# Altium footprint library mw.PcbLib: 113 footprints (part 4 of 8)
Each footprint in its own frame and in the unit in brackets; x right, y up, seen from the top. Pads: shape width x height; smd on the part's side, far side on the other; paste and mask are expansions set on the pad; w line width, h text height; cw(c..) or ccw(c..) is an arc to the next point about the centre after c.
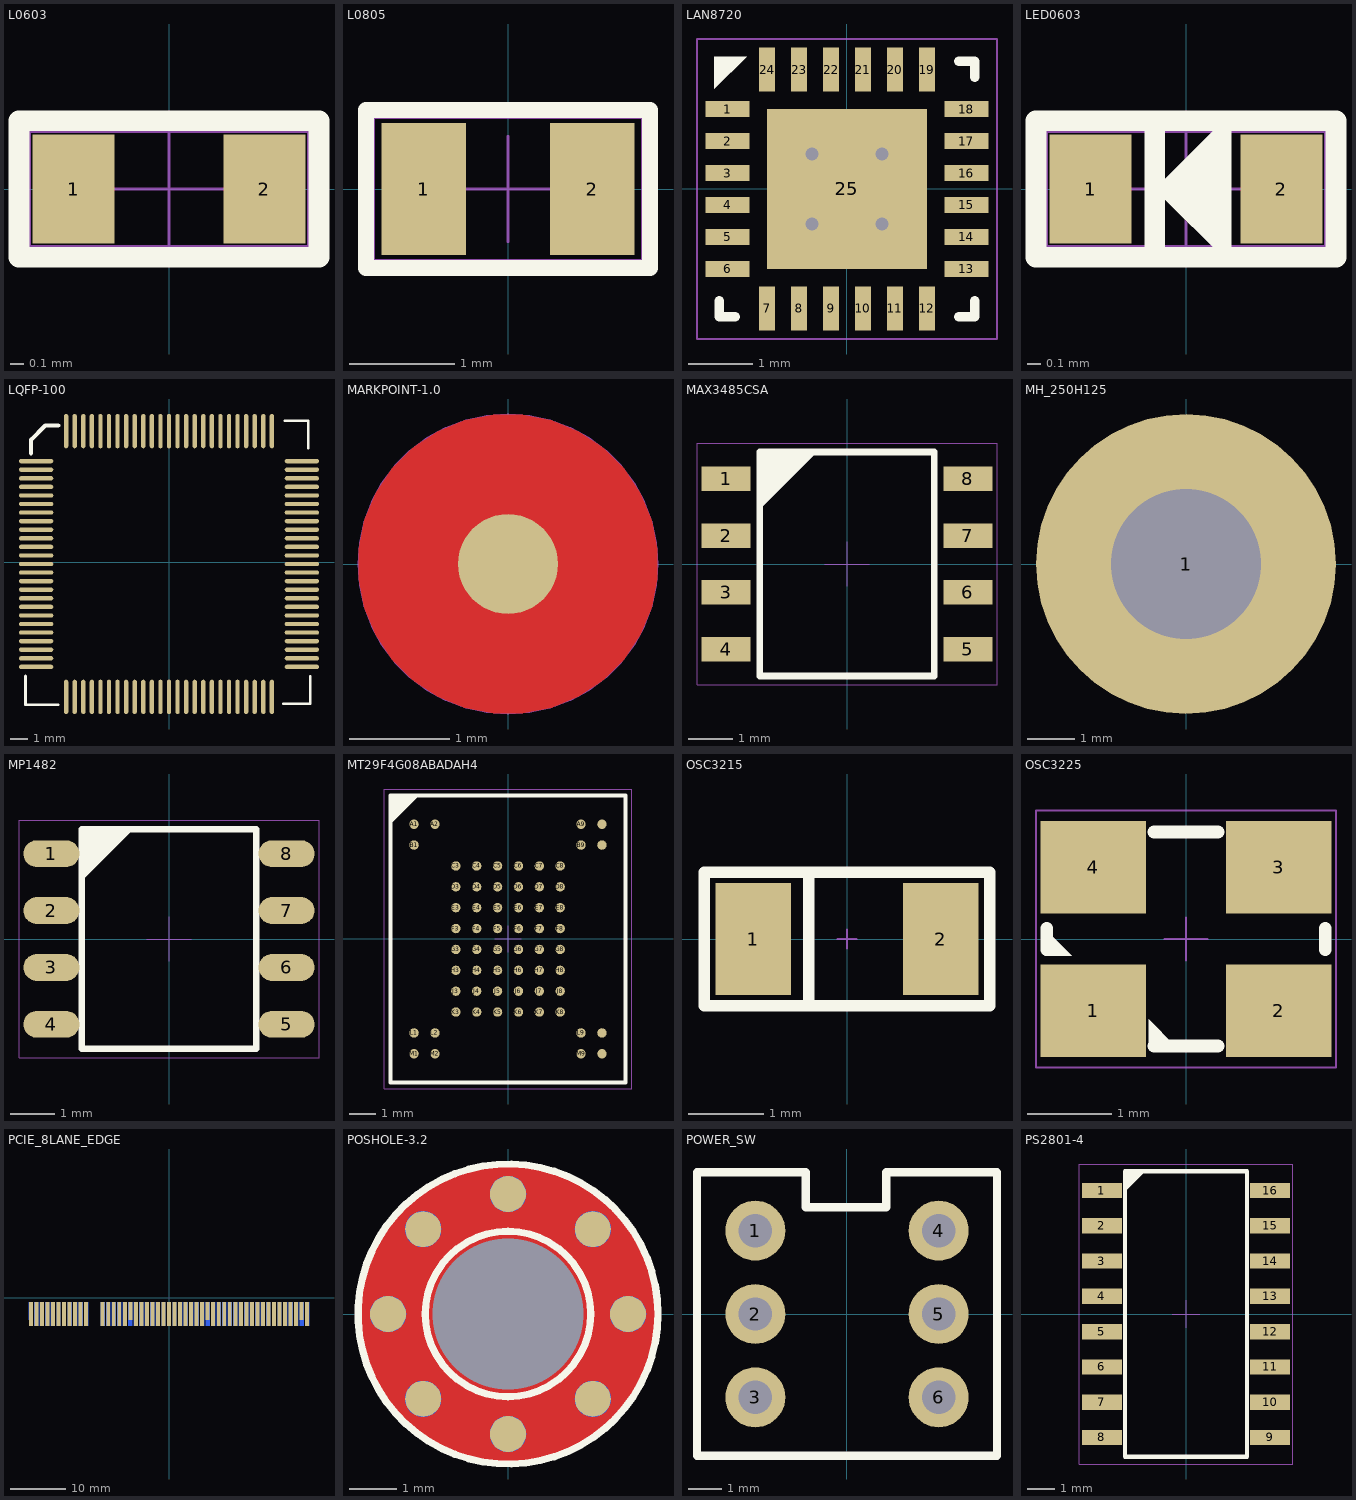
[diagram p3: the footprints below, top view; thin cyan lines are the x and y axes]

## L0603 [mm]
pads (2):
  rect 0.6x0.8 smd: 1(-0.7,0) 2(0.7,0)
Top Overlay:
  lines w0.152: -1.1,-0.5 1.1,-0.5 1.1,0.5 -1.1,0.5 -1.1,-0.5
Mechanical 15:
  lines w0.025: -0.45,0 0.45,0 ; 0,-0.45 0,0.45 ; -1.024,-0.424 1.024,-0.424 1.024,0.424 -1.024,0.424 -1.024,-0.424
3D body "0603-thick5.STEP": height 0.5, standoff 0, extent -0.81,-0.404 0.79,0.405

## L0805 [mm] "C0805"
pads (2):
  rect 0.8x1.25 smd: 1(-0.8,0) 2(0.8,0)
Top Overlay:
  lines w0.152: -1.35,-0.75 -1.35,0.75 1.35,0.75 1.35,-0.75 -1.35,-0.75
Mechanical 15:
  lines w0.025: -0.5,0 0.5,0 ; 0,-0.5 0,0.5 ; -1.275,-0.676 -1.275,0.676 1.275,0.676 1.275,-0.676 -1.275,-0.676
3D body "0805-thickM.STEP": height 1.19, standoff 0, extent -0.989,-0.66 1.011,0.665

## LAN8720 [mm] "QFN, 24-Leads, Body 4.00x4.00mm, Pitch 0.50mm, Thermal Pad 2.50x2.50mm, IPC High Density"
height 0.85
pads (25):
  rect 0.69x0.25 smd: 1(-1.87,1.25) 2(-1.87,0.75) 3(-1.87,0.25) 4(-1.87,-0.25) 5(-1.87,-0.75) 6(-1.87,-1.25) 13(1.87,-1.25) 14(1.87,-0.75) 15(1.87,-0.25) 16(1.87,0.25) 17(1.87,0.75) 18(1.87,1.25)
  rect 0.25x0.69 smd: 7(-1.25,-1.87) 8(-0.75,-1.87) 9(-0.25,-1.87) 10(0.25,-1.87) 11(0.75,-1.87) 12(1.25,-1.87) 19(1.25,1.87) 20(0.75,1.87) 21(0.25,1.87) 22(-0.25,1.87) 23(-0.75,1.87) 24(-1.25,1.87)
  rect 2.5x2.5 smd: 25(0,0)
via 0.55,-0.55 diameter 0.45 hole 0.2
via -0.55,-0.55 diameter 0.45 hole 0.2
via 0.55,0.55 diameter 0.45 hole 0.2
via -0.55,0.55 diameter 0.45 hole 0.2
Top Overlay:
  region: -1.57,2.075 -2.077,1.568 -2.077,2.075
  lines w0.152: -2,-1.751 -2,-2 -1.751,-2 ; 1.751,-2 2,-2 2,-1.751 ; 1.751,2 2,2 2,1.751
Mechanical 15:
  lines w0.025: -0.5,0 0.5,0 ; 0,-0.5 0,0.5 ; -2.35,-2.35 2.35,-2.35 2.35,2.35 -2.35,2.35 -2.35,-2.35

## LED0603 [mm] "Chip LED, 2-Leads, Body 1.60x0.80mm, IPC High Density"
height 0.45
pads (2):
  rect 0.6x0.8 smd: 1(-0.7,0) 2(0.7,0)
Top Overlay:
  region: 0.33,0.559 -0.229,0 0.33,-0.559
  lines w0.152: -0.229,-0.5 -0.229,0.5 ; -1.1,-0.5 -1.1,0.5 1.1,0.5 1.1,-0.5 -1.1,-0.5
Mechanical 15:
  lines w0.025: -0.45,0 0.45,0 ; 0,-0.45 0,0.45 ; -1.024,-0.424 1.024,-0.424 1.024,0.424 -1.024,0.424 -1.024,-0.424
3D body "led0603.STEP": height 0.65, standoff 0.01, extent -0.85,-0.394 0.85,0.406

## LQFP-100 [mm] "LQFP-100"
pads (100):
  oval 2x0.25 smd: 1(-7.75,5.899) 2(-7.75,5.399) 3(-7.75,4.899) 4(-7.75,4.399) 5(-7.75,3.899) 6(-7.75,3.399) 7(-7.75,2.899) 8(-7.75,2.399) 9(-7.75,1.899) 10(-7.75,1.399) 11(-7.75,0.899) 12(-7.75,0.399) 13(-7.75,-0.101) 14(-7.75,-0.601) 15(-7.75,-1.101) 16(-7.75,-1.601) 17(-7.75,-2.101) 18(-7.75,-2.601) 19(-7.75,-3.101) 20(-7.75,-3.601) 21(-7.75,-4.101) 22(-7.75,-4.601) 23(-7.75,-5.101) 24(-7.75,-5.601) 25(-7.75,-6.101) 51(7.75,-6.101) 52(7.75,-5.601) 53(7.75,-5.101) 54(7.75,-4.601) 55(7.75,-4.101) 56(7.75,-3.601) 57(7.75,-3.101) 58(7.75,-2.601) 59(7.75,-2.101) 60(7.75,-1.601) 61(7.75,-1.101) 62(7.75,-0.601) 63(7.75,-0.101) 64(7.75,0.399) 65(7.75,0.899) 66(7.75,1.399) 67(7.75,1.899) 68(7.75,2.399) 69(7.75,2.899) 70(7.75,3.399) 71(7.75,3.899) 72(7.75,4.399) 73(7.75,4.899) 74(7.75,5.399) 75(7.75,5.899)
  oval 0.25x2 smd: 26(-6,-7.851) 27(-5.5,-7.851) 28(-5,-7.851) 29(-4.5,-7.851) 30(-4,-7.851) 31(-3.5,-7.851) 32(-3,-7.851) 33(-2.5,-7.851) 34(-2,-7.851) 35(-1.5,-7.851) 36(-1,-7.851) 37(-0.5,-7.851) 38(0,-7.851) 39(0.5,-7.851) 40(1,-7.851) 41(1.5,-7.851) 42(2,-7.851) 43(2.5,-7.851) 44(3,-7.851) 45(3.5,-7.851) 46(4,-7.851) 47(4.5,-7.851) 48(5,-7.851) 49(5.5,-7.851) 50(6,-7.851) 76(6,7.649) 77(5.5,7.649) 78(5,7.649) 79(4.5,7.649) 80(4,7.649) 81(3.5,7.649) 82(3,7.649) 83(2.5,7.649) 84(2,7.649) 85(1.5,7.649) 86(1,7.649) 87(0.5,7.649) 88(0,7.649) 89(-0.5,7.649) 90(-1,7.649) 91(-1.5,7.649) 92(-2,7.649) 93(-2.5,7.649) 94(-3,7.649) 95(-3.5,7.649) 96(-4,7.649) 97(-4.5,7.649) 98(-5,7.649) 99(-5.5,7.649) 100(-6,7.649)
Top Overlay:
  lines w0.152: -8.369,-6.637 -8.369,-8.315 -6.469,-8.315 ; 6.673,-8.247 8.233,-8.247 8.233,-6.664 ; 6.762,8.245 8.121,8.245 8.121,6.645
  lines w0.254: -8.052,6.351 -8.052,7.138 -7.214,7.976 -6.452,7.976

## MARKPOINT-1.0 [mm]
pads (2):
  round 1 smd: ""(0,0)
  round 3 on Top Solder: ""(0,0)
Top Layer:
  pour cut-out: 0,-1.494 -0.147,-1.494 -0.436,-1.437 -0.708,-1.324 -0.952,-1.161 -1.161,-0.952 -1.324,-0.708 -1.437,-0.436 -1.494,-0.147 -1.494,0 -1.494,0.147 -1.437,0.436 -1.324,0.708 -1.161,0.952 -0.952,1.161 -0.708,1.324 -0.436,1.437 -0.147,1.494 0,1.494 0.147,1.494 0.436,1.437 0.708,1.324 0.952,1.161 1.161,0.952 1.324,0.708 1.437,0.436 1.494,0.147 1.494,0 1.494,-0.147 1.437,-0.436 1.324,-0.708 1.161,-0.952 0.952,-1.161 0.708,-1.324 0.436,-1.437 0.147,-1.494
Mechanical 15:
  circle w0.025: c0,0 r1.494

## MAX3485CSA [mm]
height 1.7
pads (8):
  rect 1.1x0.55 smd: 1(-2.7,1.905) 2(-2.7,0.635) 3(-2.7,-0.635) 4(-2.7,-1.905) 5(2.7,-1.905) 6(2.7,-0.635) 7(2.7,0.635) 8(2.7,1.905)
Top Overlay:
  region: -0.635,2.54 -1.905,1.27 -1.95,1.27 -1.95,2.5
  lines w0.152: -1.95,-2.5 1.95,-2.5 1.95,2.5 -1.95,2.5 -1.95,-2.5
Mechanical 15:
  lines w0.025: -0.5,0 0.5,0 ; 0,-0.5 0,0.5 ; -3.35,-2.7 3.35,-2.7 3.35,2.7 -3.35,2.7 -3.35,-2.7
3D body "max3485.STEP": height 1.78, standoff 0, extent -3.128,-2.5 3.128,2.5

## MH_250H125 [mm] "MH_250H125"
pads (1):
  round 6.35 hole 3.175: 1(0,0)
Mechanical 10:
  text "1" at -0.406,0 h0.51

## MP1482 [mm]
height 1.75
pads (8):
  oval 1.25x0.6 smd: 1(-2.625,1.905) 2(-2.625,0.635) 3(-2.625,-0.635) 4(-2.625,-1.905) 5(2.625,-1.905) 6(2.625,-0.635) 7(2.625,0.635) 8(2.625,1.905)
Top Overlay:
  region: -1.936,2.43 -1.916,2.45 -0.8,2.45 -1.95,1.3
  lines w0.152: -1.95,-2.45 -1.95,2.45 1.95,2.45 1.95,-2.45 -1.95,-2.45
Mechanical 15:
  lines w0.025: -0.5,0 0.5,0 ; 0,-0.5 0,0.5 ; -3.35,-2.65 -3.35,2.65 3.35,2.65 3.35,-2.65 -3.35,-2.65
3D body "mp1482.STEP": height 1.74, standoff 0, extent -3.023,-2.428 3.132,2.472

## MT29F4G08ABADAH4 [mm] "BGA, 63-Leads, Body 9.00x11.00mmx1.00mm, Pitch 0.80mm"
height 1
pads (63):
  round 0.36 smd: A1(-3.6,4.4) A2(-2.8,4.4) A9(2.8,4.4) A10(3.6,4.4) B1(-3.6,3.6) B9(2.8,3.6) B10(3.6,3.6) C3(-2,2.8) C4(-1.2,2.8) C5(-0.4,2.8) C6(0.4,2.8) C7(1.2,2.8) C8(2,2.8) D3(-2,2) D4(-1.2,2) D5(-0.4,2) D6(0.4,2) D7(1.2,2) D8(2,2) E3(-2,1.2) E4(-1.2,1.2) E5(-0.4,1.2) E6(0.4,1.2) E7(1.2,1.2) E8(2,1.2) F3(-2,0.4) F4(-1.2,0.4) F5(-0.4,0.4) F6(0.4,0.4) F7(1.2,0.4) F8(2,0.4) G3(-2,-0.4) G4(-1.2,-0.4) G5(-0.4,-0.4) G6(0.4,-0.4) G7(1.2,-0.4) G8(2,-0.4) H3(-2,-1.2) H4(-1.2,-1.2) H5(-0.4,-1.2) H6(0.4,-1.2) H7(1.2,-1.2) H8(2,-1.2) J3(-2,-2) J4(-1.2,-2) J5(-0.4,-2) J6(0.4,-2) J7(1.2,-2) J8(2,-2) K3(-2,-2.8) K4(-1.2,-2.8) K5(-0.4,-2.8) K6(0.4,-2.8) K7(1.2,-2.8) K8(2,-2.8) L1(-3.6,-3.6) L2(-2.8,-3.6) L9(2.8,-3.6) L10(3.6,-3.6) M1(-3.6,-4.4) M2(-2.8,-4.4) M9(2.8,-4.4) M10(3.6,-4.4)
Top Overlay:
  region: -3.5,5.5 -4.5,4.5 -4.5,5.5
  lines w0.152: -4.5,4.5 -3.5,5.5 ; -4.5,-5.5 -4.5,5.5 4.5,5.5 4.5,-5.5 -4.5,-5.5
Mechanical 15:
  lines w0.025: -0.5,0 0.5,0 ; 0,-0.5 0,0.5 ; -4.75,-5.75 -4.75,5.75 4.75,5.75 4.75,-5.75 -4.75,-5.75

## OSC3215 [mm]
pads (2):
  rect 1x1.5 smd: 1(-1.25,0) 2(1.25,0)
Top Overlay:
  lines w0.152: -0.508,-0.889 -0.508,0.889 ; -1.905,-0.889 -1.905,0.889 1.905,0.889 1.905,-0.889 -1.905,-0.889
Mechanical 15:
  lines w0.025: -0.127,0 0.127,0 ; 0,-0.127 0,0.127 ; -1.905,-0.889 -1.905,0.889 1.905,0.889 1.905,-0.889 -1.905,-0.889

## OSC3225 [mm]
pads (4):
  rect 1.25x1.1 smd: 1(-1.1,-0.85) 2(1.1,-0.85) 3(1.1,0.85) 4(-1.1,0.85)
Top Overlay:
  region: -1.355,-0.197 -1.672,0.12 -1.672,-0.197
  region: -0.127,-1.271 -0.444,-0.954 -0.444,-1.271
  lines w0.152: -1.651,-0.127 -1.651,0.127 ; -0.381,-1.27 0.381,-1.27 ; -0.381,1.27 0.381,1.27 ; 1.651,-0.127 1.651,0.127
Mechanical 15:
  lines w0.025: -0.254,0 0.254,0 ; 0,-0.254 0,0.254 ; -1.778,-1.524 1.778,-1.524 1.778,1.524 -1.778,1.524 -1.778,-1.524
3D body "3225.STEP": height 1.13, standoff 0, extent -1.6,-1.25 1.6,1.25

## PCIE_8LANE_EDGE [mil] "PCIE_8LANE_EDGE"
pads (98):
  rect 28x126 smd far side: A1(-984.25,-93.98)
  rect 28x169 smd far side: A2(-944.88,-115.48) A3(-905.51,-115.48) A4(-866.14,-115.48) A5(-826.77,-115.48) A6(-787.4,-115.48) A7(-748.03,-115.48) A8(-708.66,-115.48) A9(-669.29,-115.48) A10(-629.92,-115.48) A11(-590.55,-115.48) A12(-472.44,-115.48) A13(-433.07,-115.48) A14(-393.7,-115.48) A15(-354.33,-115.48) A16(-314.96,-115.48) A17(-275.59,-115.48) A18(-236.22,-115.48) A19(-196.85,-115.48) A20(-157.48,-115.48) A21(-118.11,-115.48) A22(-78.74,-115.48) A23(-39.37,-115.48) A24(0,-115.48) A25(39.37,-115.48) A26(78.74,-115.48) A27(118.11,-115.48) A28(157.48,-115.48) A29(196.85,-115.48) A30(236.22,-115.48) A31(275.59,-115.48) A32(314.96,-115.48) A33(354.33,-115.48) A34(393.7,-115.48) A35(433.07,-115.48) A36(472.44,-115.48) A37(511.81,-115.48) A38(551.18,-115.48) A39(590.55,-115.48) A40(629.92,-115.48) A41(669.29,-115.48) A42(708.66,-115.48) A43(748.03,-115.48) A44(787.4,-115.48) A45(826.77,-115.48) A46(866.14,-115.48) A47(905.51,-115.48) A48(944.88,-115.48) A49(984.25,-115.48)
  rect 28x169 smd: B1(-984.25,-115.48) B2(-944.88,-115.48) B3(-905.51,-115.48) B4(-866.14,-115.48) B5(-826.77,-115.48) B6(-787.4,-115.48) B7(-748.03,-115.48) B8(-708.66,-115.48) B9(-669.29,-115.48) B10(-629.92,-115.48) B11(-590.55,-115.48) B12(-472.44,-115.48) B13(-433.07,-115.48) B14(-393.7,-115.48) B15(-354.33,-115.48) B16(-314.96,-115.48) B18(-236.22,-115.48) B19(-196.85,-115.48) B20(-157.48,-115.48) B21(-118.11,-115.48) B22(-78.74,-115.48) B23(-39.37,-115.48) B24(0,-115.48) B25(39.37,-115.48) B26(78.74,-115.48) B27(118.11,-115.48) B28(157.48,-115.48) B29(196.85,-115.48) B30(236.22,-115.48) B32(314.96,-115.48) B33(354.33,-115.48) B34(393.7,-115.48) B35(433.07,-115.48) B36(472.44,-115.48) B37(511.81,-115.48) B38(551.18,-115.48) B39(590.55,-115.48) B40(629.92,-115.48) B41(669.29,-115.48) B42(708.66,-115.48) B43(748.03,-115.48) B44(787.4,-115.48) B45(826.77,-115.48) B46(866.14,-115.48) B47(905.51,-115.48) B49(984.25,-115.48)
  rect 28x126 smd: B17(-275.59,-93.98) B31(275.59,-93.98) B48(944.88,-93.98)

## POSHOLE-3.2 [mil] "3.2mm hole"
pads (17):
  round 30 smd: ""(-100,0) ""(-70.71,-70.71) ""(-70.71,70.71) ""(0,-100) ""(0,100) ""(70.71,-70.71) ""(70.71,70.71) ""(100,0)
  round 30 smd far side: ""(-100,0) ""(-70.71,-70.71) ""(-70.71,70.71) ""(0,-100) ""(0,100) ""(70.71,-70.71) ""(70.71,70.71) ""(100,0)
  round 0 hole 125.98 unplated: ""(0,0)
Top Layer:
  pour cut-out: 0,-125 -8.19,-125 -24.44,-122.86 -40.27,-118.62 -55.4,-112.35 -69.6,-104.16 -82.59,-94.18 -94.18,-82.59 -104.16,-69.6 -112.35,-55.4 -118.62,-40.27 -122.86,-24.44 -125,-8.19 -125,0 -125,8.19 -122.86,24.44 -118.62,40.27 -112.35,55.4 -104.16,69.6 -94.18,82.59 -82.59,94.18 -69.6,104.16 -55.4,112.35 -40.27,118.62 -24.44,122.86 -8.19,125 0,125 8.19,125 24.44,122.86 40.27,118.62 55.4,112.35 69.6,104.16 82.59,94.18 94.18,82.59 104.16,69.6 112.35,55.4 118.62,40.27 122.86,24.44 125,8.19 125,0 125,-8.19 122.86,-24.44 118.62,-40.27 112.35,-55.4 104.16,-69.6 94.18,-82.59 82.59,-94.18 69.6,-104.16 55.4,-112.35 40.27,-118.62 24.44,-122.86 8.19,-125
Bottom Layer:
  pour cut-out: 0,-125 -8.19,-125 -24.44,-122.86 -40.27,-118.62 -55.4,-112.35 -69.6,-104.16 -82.59,-94.18 -94.18,-82.59 -104.16,-69.6 -112.35,-55.4 -118.62,-40.27 -122.86,-24.44 -125,-8.19 -125,0 -125,8.19 -122.86,24.44 -118.62,40.27 -112.35,55.4 -104.16,69.6 -94.18,82.59 -82.59,94.18 -69.6,104.16 -55.4,112.35 -40.27,118.62 -24.44,122.86 -8.19,125 0,125 8.19,125 24.44,122.86 40.27,118.62 55.4,112.35 69.6,104.16 82.59,94.18 94.18,82.59 104.16,69.6 112.35,55.4 118.62,40.27 122.86,24.44 125,8.19 125,0 125,-8.19 122.86,-24.44 118.62,-40.27 112.35,-55.4 104.16,-69.6 94.18,-82.59 82.59,-94.18 69.6,-104.16 55.4,-112.35 40.27,-118.62 24.44,-122.86 8.19,-125
Top Overlay:
  circle w6: c0,0 r68.9
  circle w6: c0,0 r125
Bottom Overlay:
  circle w6: c0,0 r125
  circle w6: c0,0 r68.9
Mechanical 15:
  circle w1: c0,0 r125
  lines w1: -20,0 20,0 ; 0,-20 0,20

## POWER_SW [mm] "POWER_SW"
pads (6):
  round 1.8 hole 1: 1(-2.75,2.5) 2(-2.75,0) 3(-2.75,-2.5) 4(2.75,2.5) 5(2.75,0) 6(2.75,-2.5)
Top Overlay:
  lines w0.254: -4.5,-4.25 4.5,-4.25 4.5,4.25 1.175,4.25 1.175,3.2 -1.238,3.2 -1.238,4.25 -4.5,4.25 -4.5,-4.25
Mechanical 12:
  lines w0.025: -4.5,4.25 -4.5,-4.25 4.5,-4.25 4.5,4.25

## PS2801-4 [mm] "SOP, 16-Leads, Body 10.28x4.40mm, Pitch 1.27mm, IPC High Density"
height 2.2
pads (16):
  rect 1.45x0.55 smd: 1(-3.025,4.445) 2(-3.025,3.175) 3(-3.025,1.905) 4(-3.025,0.635) 5(-3.025,-0.635) 6(-3.025,-1.905) 7(-3.025,-3.175) 8(-3.025,-4.445) 9(3.025,-4.445) 10(3.025,-3.175) 11(3.025,-1.905) 12(3.025,-0.635) 13(3.025,0.635) 14(3.025,1.905) 15(3.025,3.175) 16(3.025,4.445)
Top Overlay:
  region: -1.478,5.126 -2.2,4.404 -2.2,5.14
  lines w0.152: -2.2,-5.14 -2.2,5.14 2.2,5.14 2.2,-5.14 -2.2,-5.14
Mechanical 15:
  lines w0.025: -0.5,0 0.5,0 ; 0,-0.5 0,0.5 ; -3.85,-5.4 -3.85,5.4 3.85,5.4 3.85,-5.4 -3.85,-5.4